# Altium footprint library Library.PcbLib: 225 footprints (part 7 of 16)
Each footprint in its own frame and in the unit in brackets; x right, y up, seen from the top. Pads: shape width x height; smd on the part's side, far side on the other; paste and mask are expansions set on the pad; w line width, h text height; cw(c..) or ccw(c..) is an arc to the next point about the centre after c.
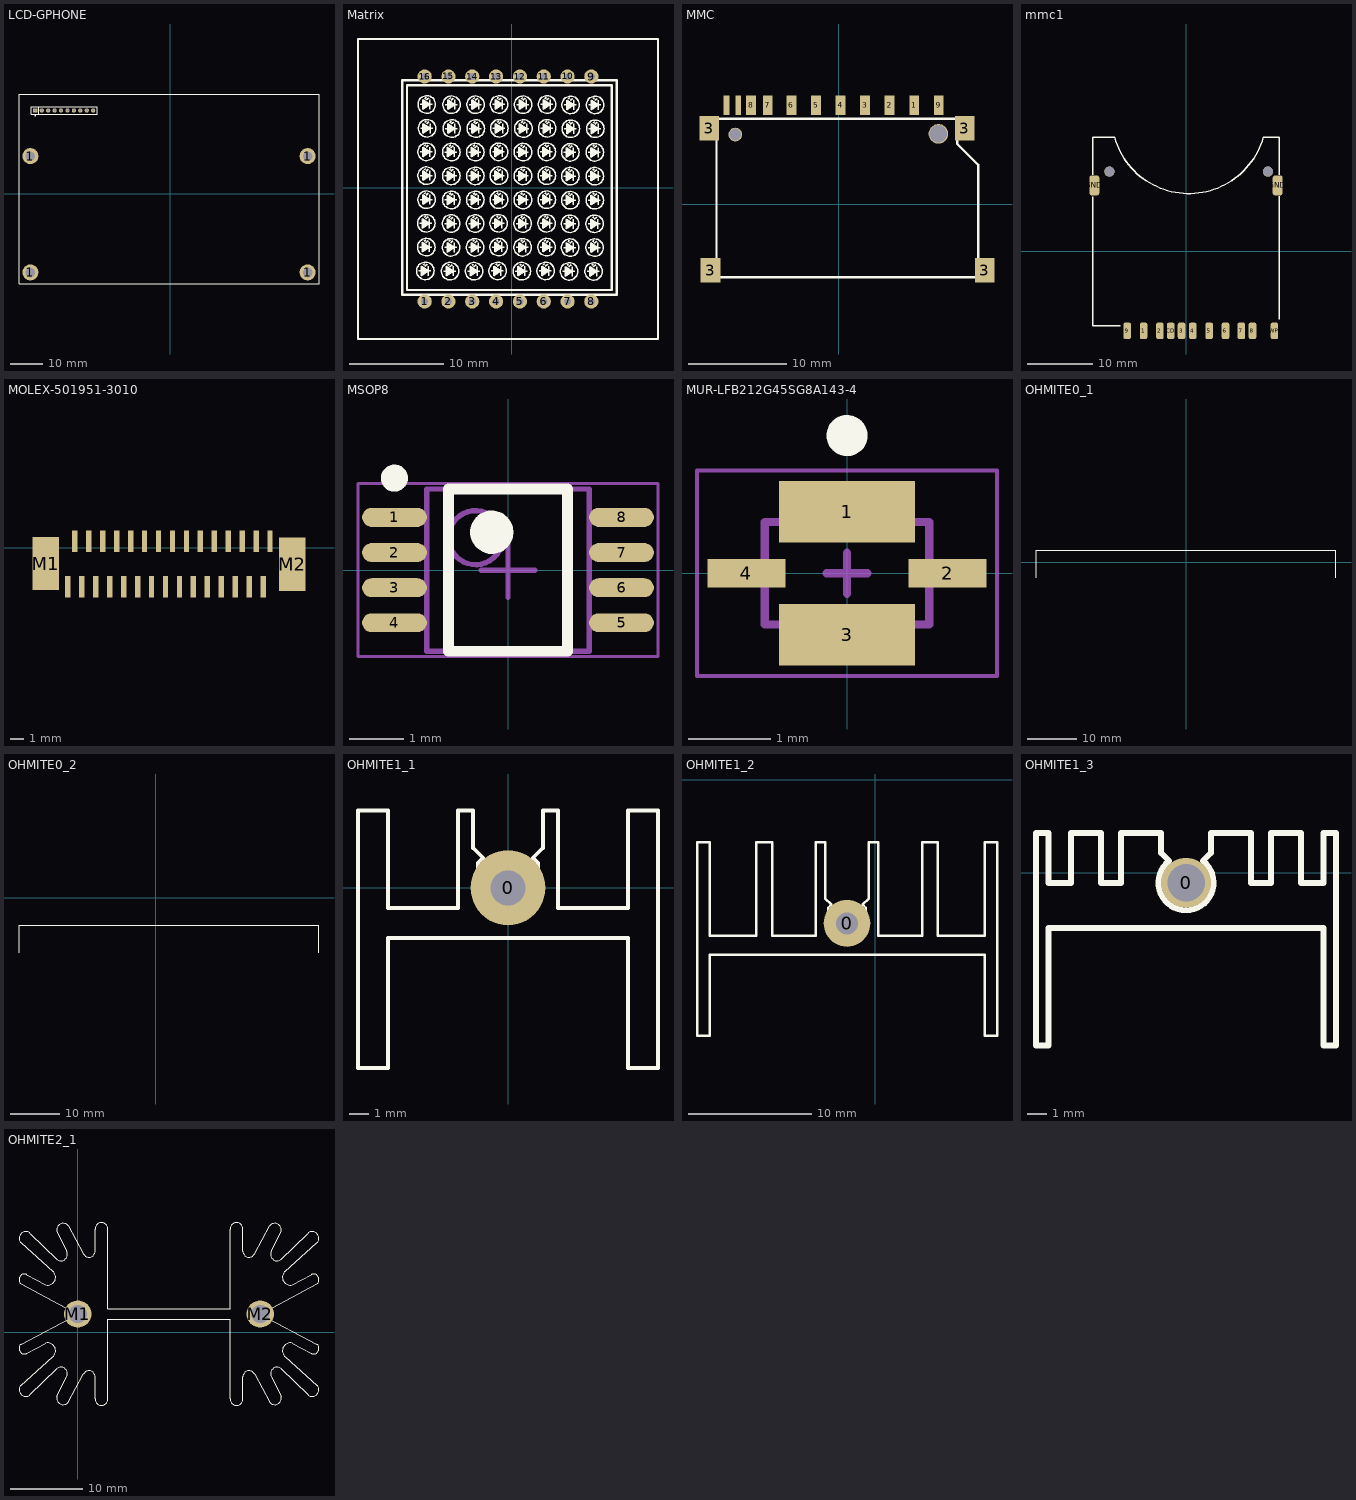
[diagram p6: the footprints below, top view; thin cyan lines are the x and y axes]

## LCD-GPHONE [mm] "10p, 1 row, straight, gold plating"
height 4.3
pads (19):
  round 5 hole 3: 1(-43.561,-24.511) 1(-43.561,11.684) 1(42.672,-24.511) 1(42.672,11.684)
  rect 1.3x1.3 hole 0.8: 1(-42.037,25.908)
  round 1.3 hole 0.8: 2(-40.037,25.908) 3(-38.037,25.908) 4(-36.037,25.908) 5(-34.037,25.908) 6(-32.037,25.908) 7(-30.037,25.908) 8(-28.037,25.908) 9(-26.037,25.908) 10(-24.037,25.908)
  round 0 all layers, no hole: ""(-43.561,-24.511) ""(-43.561,11.684) ""(42.672,-24.511) ""(42.672,-24.511) ""(42.672,11.684)
Top Overlay:
  circle w0.25: c-42.037,24.326 r0.125
  lines w0.127: -41.037,24.708 -41.037,27.108 ; -43.287,24.708 -22.787,24.708 -22.787,27.108 -43.287,27.108 -43.287,24.708
  lines w0.2: -47.117,-28.067 46.228,-28.067 46.228,30.988 -47.117,30.988 -47.117,-5.588 -47.117,-20.574 -47.117,-28.067
3D body "62001011821.stp": height 4.31, standoff -2.39, extent -43.287,24.708 -22.787,27.108

## Matrix [mil]
pads (16):
  round 60 hole 30: 1(-366,-478.44) 2(-266,-478.44) 3(-166,-478.44) 4(-66,-478.44) 5(34,-478.44) 6(134,-478.44) 7(234,-478.44) 8(334,-478.44) 9(334,466.44) 10(234,466.44) 11(134,466.44) 12(34,466.44) 13(-66,466.44) 14(-166,466.44) 15(-266,466.44) 16(-366,466.44)
Top Overlay:
  drawing of 588 lines, arcs and shapes, not listed
3D body "User Library-Bicolor-LED-Matrix.step": height 236.82, standoff -314.4, extent -644.92,-634.84 614.92,625

## MMC [mm]
pads (17):
  rect 1x2 smd: 1(7.67,10.109) 2(5.17,10.109) 3(2.67,10.109) 4(0.17,10.109) 5(-2.33,10.109) 6(-4.83,10.109) 7(-7.255,10.109) 8(-8.955,10.109) 9(10.17,10.109)
  rect 2x2.5 smd: 3(-13.208,7.747) 3(-13.081,-6.731) 3(12.827,7.747) 3(14.859,-6.731)
  rect 0.6x2 smd: NC1(-11.455,10.109) NC2(-10.255,10.109)
  round 1.4 hole 1.2: ""(-10.555,7.109)
  round 2 hole 1.8: ""(10.135,7.188)
Top Overlay:
  lines w0.254: -12.471,-7.417 14.199,-7.417 14.199,4.013 12.04,6.172 12.04,8.712 -12.471,8.712 -12.471,-7.417
3D body "SD card.stp": height 2.23, standoff 0.13, extent -11.046,-26.668 12.954,5.332
3D body "693063020911.stp": height 2.75, standoff -0.8, extent -13.511,-8.163 15.289,10.287

## mmc1 [mm] "SD Card socket"
height 2.75
pads (15):
  rrect50% 1.16x2.5 smd: 1(-6.48,-12.15) 2(-3.98,-12.15) 4(1.03,-12.15) 5(3.53,-12.15) 7(8.45,-12.15) 8(10.15,-12.15) 9(-8.98,-12.15) CD(-2.33,-12.15) WP(13.5,-12.15)
  rrect50% 1.16x2.5 smd mask+0: 3(-0.68,-12.15) 6(6.03,-12.15)
  rrect50% 1.524x3.048 smd mask+0: GND(-14,10.05) GND(14,10.05)
  round 1.55 hole 1.55 unplated: ""(-11.7,12.15) ""(12.5,12.15)
Top Overlay:
  lines w0.2: -14.22,8.3 -14.22,-11.4 -10,-11.4 ; -14.22,11.7 -14.22,17.391 -14.216,17.396 -10.915,17.396 ccw(c0.441,20.6) 11.799,17.4 14.22,17.4 14.22,11.7 ; 14.22,-10.4 14.22,8.4
3D body "693061010911.stp": height 3.25, standoff -0.15, extent -14.527,-13.11 14.273,16.79
3D body "SD card.stp": height 2.79, standoff 0.69, extent -11.365,-9.775 12.635,22.225

## MOLEX-501951-3010 [mil] "MOLEX FPC CONNECTOR 30 POSITIONS"
pads (32):
  rect 15x60 smd: 1(374.02,-109.8) 2(393.7,19.37) 3(413.39,-109.8) 4(433.07,19.37) 5(452.76,-109.8) 6(472.44,19.37) 7(492.13,-109.8) 8(511.81,19.37) 9(531.5,-109.8) 10(551.18,19.37) 11(570.87,-109.8) 12(590.55,19.37) 13(610.24,-109.8) 14(629.92,19.37) 15(649.61,-109.8) 16(669.29,19.37) 17(688.98,-109.8) 18(708.66,19.37) 19(728.35,-109.8) 20(748.03,19.37) 21(767.72,-109.8) 22(787.4,19.37) 23(807.09,-109.8) 24(826.77,19.37) 25(846.46,-109.8) 26(866.14,19.37) 27(885.83,-109.8) 28(905.51,19.37) 29(925.2,-109.8) 30(944.88,19.37)
  rect 75x150 smd: M1(311,-44) M2(1008,-46)
3D body "5019513010.stp": height 157.4, standoff -2.05, extent 309,-117.58 1009.79,59.58

## MSOP8 [mm] "MSOP, 8-Leads, Body 3.00x3.00mm, Pitch 0.65mm, IPC High Density"
height 1
pads (8):
  oval 1.2x0.35 smd: 1(-2.1,0.975) 2(-2.1,0.325) 3(-2.1,-0.325) 4(-2.1,-0.975) 5(2.1,-0.975) 6(2.1,-0.325) 7(2.1,0.325) 8(2.1,0.975)
Top Overlay:
  circle w0.4: c-0.3,0.7 r0.2
  circle w0.25: c-2.1,1.7 r0.125
  lines w0.2: -1.1,-1.5 1.1,-1.5 1.1,1.5 -1.1,1.5 -1.1,-1.5
Mechanical 13:
  circle w0.1: c-0.6,0.6 r0.5
  lines w0.1: -1.5,-1.5 1.5,-1.5 1.5,1.5 -1.5,1.5 -1.5,-1.5
Mechanical 15:
  lines w0.05: -2.775,-1.6 2.775,-1.6 2.775,1.6 -2.775,1.6 -2.775,-1.6
  lines w0.1: -0.5,0 0.5,0 ; 0,-0.5 0,0.5
3D body "29213.stp": height 0.94, standoff -0.04, extent -2,-1.45 2,1.45

## MUR-LFB212G45SG8A143-4 [mm] "Hand Drawn, 4-Leads, Body 2x1.25mm"
height 0.95
pads (4):
  rect 1.65x0.75 smd: 1(0,0.75) 3(0,-0.75)
  rect 0.95x0.35 smd: 2(1.225,0) 4(-1.225,0)
Top Overlay:
  circle w0.25: c0,1.675 r0.125
Mechanical 13:
  lines w0.1: -1,-0.625 -1,0.625 1,0.625 1,-0.625 -1,-0.625
Mechanical 15:
  lines w0.05: -1.825,-1.25 -1.825,1.25 1.825,1.25 1.825,-1.25 -1.825,-1.25
  lines w0.1: -0.25,0 0.25,0 ; 0,-0.25 0,0.25
3D body: height 0.95, standoff 0, extent -1,-0.625 1,0.625

## OHMITE0_1 [mm] "HALF BRICK CONVERTER HEATSINK"
Top Overlay:
  lines w0.102: -30.599,-3.175 -30.599,2.413 30.401,2.413 30.401,-3.175
3D body: height 37, standoff 35, extent -30.754,2.159 30.246,22.225
3D body: height 32, standoff 30, extent -30.627,2.032 30.373,22.098
3D body: height 12, standoff 10, extent -30.627,2.032 30.373,22.098
3D body: height 17, standoff 15, extent -30.627,2.159 30.373,22.225
3D body: height 22, standoff 20, extent -30.627,2.159 30.373,22.225
3D body: height 27, standoff 25, extent -30.754,2.032 30.246,22.098
3D body: height 7, standoff 5, extent -30.627,2.159 30.373,22.225
3D body: height 37, standoff 0, extent -30.5,-3.175 30.5,2.311
3D body: height 2, standoff 0, extent -30.627,2.159 30.373,22.225

## OHMITE0_2 [mm] "HALF BRICK CONVERTER HEATSINK"
Top Overlay:
  lines w0.102: -27.805,-11.176 -27.805,-5.588 33.195,-5.588 33.195,-11.176
3D body: height 12, standoff 10, extent -27.833,-5.969 33.167,14.097
3D body: height 17, standoff 15, extent -27.833,-5.842 33.167,14.224
3D body: height 27, standoff 5, extent -27.706,-11.176 33.294,-5.69
3D body: height 7, standoff 5, extent -27.833,-5.842 33.167,14.224
3D body: height 22, standoff 20, extent -27.833,-5.842 33.167,14.224
3D body: height 27, standoff 25, extent -27.96,-5.969 33.04,14.097

## OHMITE0_3 [mm] "HALF BRICK CONVERTER HEATSINK"
3D body: height 22, standoff 20, extent -24.404,-8.382 6.096,11.684
3D body: height 12, standoff 10, extent -24.404,-8.509 6.096,11.557
3D body: height 17, standoff 15, extent -24.404,-8.382 6.096,11.684
3D body: height 22, standoff 5, extent -24.277,-13.716 6.223,-8.23
3D body: height 7, standoff 5, extent -24.404,-8.382 6.096,11.684

## OHMITE0_4 [mm] "HALF BRICK CONVERTER HEATSINK"
3D body: height 37, standoff 35, extent -29.992,-6.223 99.695,13.843
3D body: height 32, standoff 30, extent -29.865,-6.35 99.695,13.716
3D body: height 12, standoff 10, extent -29.865,-6.35 99.568,13.716
3D body: height 17, standoff 15, extent -29.865,-6.223 99.568,13.843
3D body: height 22, standoff 20, extent -29.865,-6.223 99.441,13.843
3D body: height 27, standoff 25, extent -29.992,-6.35 99.568,13.716
3D body: height 7, standoff 5, extent -29.865,-6.223 99.695,13.843
3D body: height 37, standoff 0, extent -29.845,-11.506 99.568,-6.02
3D body: height 2, standoff 0, extent -29.865,-6.223 99.568,13.843

## OHMITE0_5 [mm] "HALF BRICK CONVERTER HEATSINK"
3D body: height 37, standoff 35, extent -99.06,-6.223 99.695,13.843
3D body: height 32, standoff 30, extent -99.06,-6.35 99.695,13.716
3D body: height 12, standoff 10, extent -99.06,-6.35 99.568,13.716
3D body: height 17, standoff 15, extent -98.933,-6.223 99.568,13.843
3D body: height 22, standoff 20, extent -99.06,-6.223 99.441,13.843
3D body: height 27, standoff 25, extent -98.933,-6.35 99.568,13.716
3D body: height 7, standoff 5, extent -98.933,-6.223 99.695,13.843
3D body: height 37, standoff 0, extent -99.06,-11.506 99.568,-6.02
3D body: height 2, standoff 0, extent -99.06,-6.223 99.568,13.843

## OHMITE1_1 [mil]
pads (1):
  round 150 hole 70: 0(0,0)
Top Overlay:
  lines w7: -200,-100 199,-100
  lines w8: -300,-360 -240,-360 -240,-100 240,-100 240,-360 300,-360 300,155 240,155 240,-40 100,-40 100,155 70,155 70,80 50,60 60,50 60,-20 40,-40 -40,-40 -60,-20 -60,50 -50,60 -70,80 -70,155 -100,155 -100,-40 -240,-40 -240,155 -300,155 -300,-360
3D body "User Library-Disipador 34M8491-1.STEP": height 1000, standoff -122.05, extent -246,-156.97 250.06,98.97

## OHMITE1_2 [mil]
pads (1):
  round 150 hole 70: 0(-90,-460)
Top Overlay:
  lines w8: -570,-820 -570,-200 -530,-200 -530,-500 -380,-500 -380,-200 -330,-200 -330,-500 -190,-500 -190,-200 -160,-200 -160,-380 -140,-400 -150,-410 -150,-480 -130,-500 -50,-500 -30,-480 -30,-410 -40,-400 -20,-380 -20,-200 10,-200 10,-500 150,-500 150,-200 200,-200 200,-500 350,-500 350,-200 390,-200 390,-820 350,-820 350,-560 200,-560 150,-560 -330,-560 -380,-560 -530,-560 -530,-820 -570,-820
3D body "User Library-heat sink-1.STEP": height 1205.51, standoff 0, extent -538.79,-867 362.79,-221.33

## OHMITE1_3 [mil]
pads (1):
  round 100 hole 75: 0(440,-20)
Top Overlay:
  lines w12: 406,24 390,40 390,80 310,80 310,-20 270,-20 270,80 210,80 210,-20 165,-20 165,80 140,80 140,-345 165,-345 165,-110 715,-110 715,-345 740,-345 740,80 715,80 715,-20 670,-20 670,80 610,80 610,-20 570,-20 570,80 490,80 490,40 473.59,23.59 ; 406.37,23.52 ccw(c440,-20) 473.77,23.41
3D body "SW3dPS-heatsink TO126.STEP": height 984.25, standoff -149.61, extent 150.03,-322.25 731.97,103

## OHMITE2_1 [mm]
pads (2):
  round 3.81 hole 2.54 unplated: M1(0,2.54) M2(25.4,2.54)
Top Overlay:
  lines w0.152: -7.112,-2.921 -4.445,-1.524 cw(c-4.18,-2.584) -3.498,-3.437 -7.887,-7.353 ccw(c-7.239,-8.001) -6.591,-8.649 -2.921,-5.08 cw(c-2.334,-5.764) -1.55,-6.208 -2.898,-8.897 ccw(c-2.019,-9.157) -1.304,-9.729 0.799,-5.842 cw(c1.561,-6.223) 2.413,-6.223 2.413,-9.271 ccw(c3.302,-9.271) 4.191,-9.271 4.191,1.778 12.7,1.778 21.209,1.778 21.209,-9.271 ccw(c22.098,-9.271) 22.987,-9.271 22.987,-6.223 cw(c23.839,-6.223) 24.601,-5.842 26.704,-9.729 ccw(c27.419,-9.157) 28.298,-8.897 26.95,-6.208 cw(c27.734,-5.764) 28.321,-5.08 31.991,-8.649 ccw(c32.639,-8.001) 33.287,-7.353 28.898,-3.437 cw(c29.58,-2.584) 29.845,-1.524 32.512,-2.921 ; -7.112,8.001 -4.445,6.604 ccw(c-4.18,7.664) -3.498,8.517 -7.887,12.433 cw(c-7.239,13.081) -6.591,13.729 -2.921,10.16 ccw(c-2.334,10.844) -1.55,11.288 -2.898,13.977 cw(c-2.019,14.237) -1.304,14.809 0.799,10.922 ccw(c1.561,11.303) 2.413,11.303 2.413,14.351 cw(c3.302,14.351) 4.191,14.351 4.191,3.302 12.7,3.302 21.209,3.302 21.209,14.351 cw(c22.098,14.351) 22.987,14.351 22.987,11.303 ccw(c23.839,11.303) 24.601,10.922 26.704,14.809 cw(c27.419,14.237) 28.298,13.977 26.95,11.288 ccw(c27.734,10.844) 28.321,10.16 31.991,13.729 cw(c32.639,13.081) 33.287,12.433 28.898,8.517 ccw(c29.58,7.664) 29.845,6.604 32.512,8.001 ; -7.076,-2.942 cw(c-7.417,-2.261) -7.874,-1.651 0,2.54 -7.874,6.731 cw(c-7.417,7.341) -7.076,8.022 ; 32.476,-2.942 ccw(c32.817,-2.261) 33.274,-1.651 25.4,2.54 33.274,6.731 ccw(c32.817,7.341) 32.476,8.022
3D body: height 0.51, standoff -3.05, extent 24.13,1.27 26.66,3.805
3D body: height 0.51, standoff -3.05, extent -1.27,1.27 1.26,3.805
3D body: height 63.5, standoff 0, extent 4.191,1.778 21.209,3.302
3D body: height 63.5, standoff 0, extent -8.255,-10.16 4.191,2.54
3D body: height 63.5, standoff 0, extent -8.255,2.54 4.191,15.24
3D body: height 63.5, standoff 0, extent 21.209,2.54 33.655,15.24
3D body: height 63.5, standoff 0, extent 21.209,-10.16 33.655,2.54
3D body: height 0.51, standoff -3.05, extent 24.13,1.27 26.66,3.805